# Altium footprint library Sajad_Altium_Library.PcbLib: 380 footprints (part 24 of 24)
Each footprint in its own frame and in the unit in brackets; x right, y up, seen from the top. Pads: shape width x height; smd on the part's side, far side on the other; paste and mask are expansions set on the pad; w line width, h text height; cw(c..) or ccw(c..) is an arc to the next point about the centre after c.
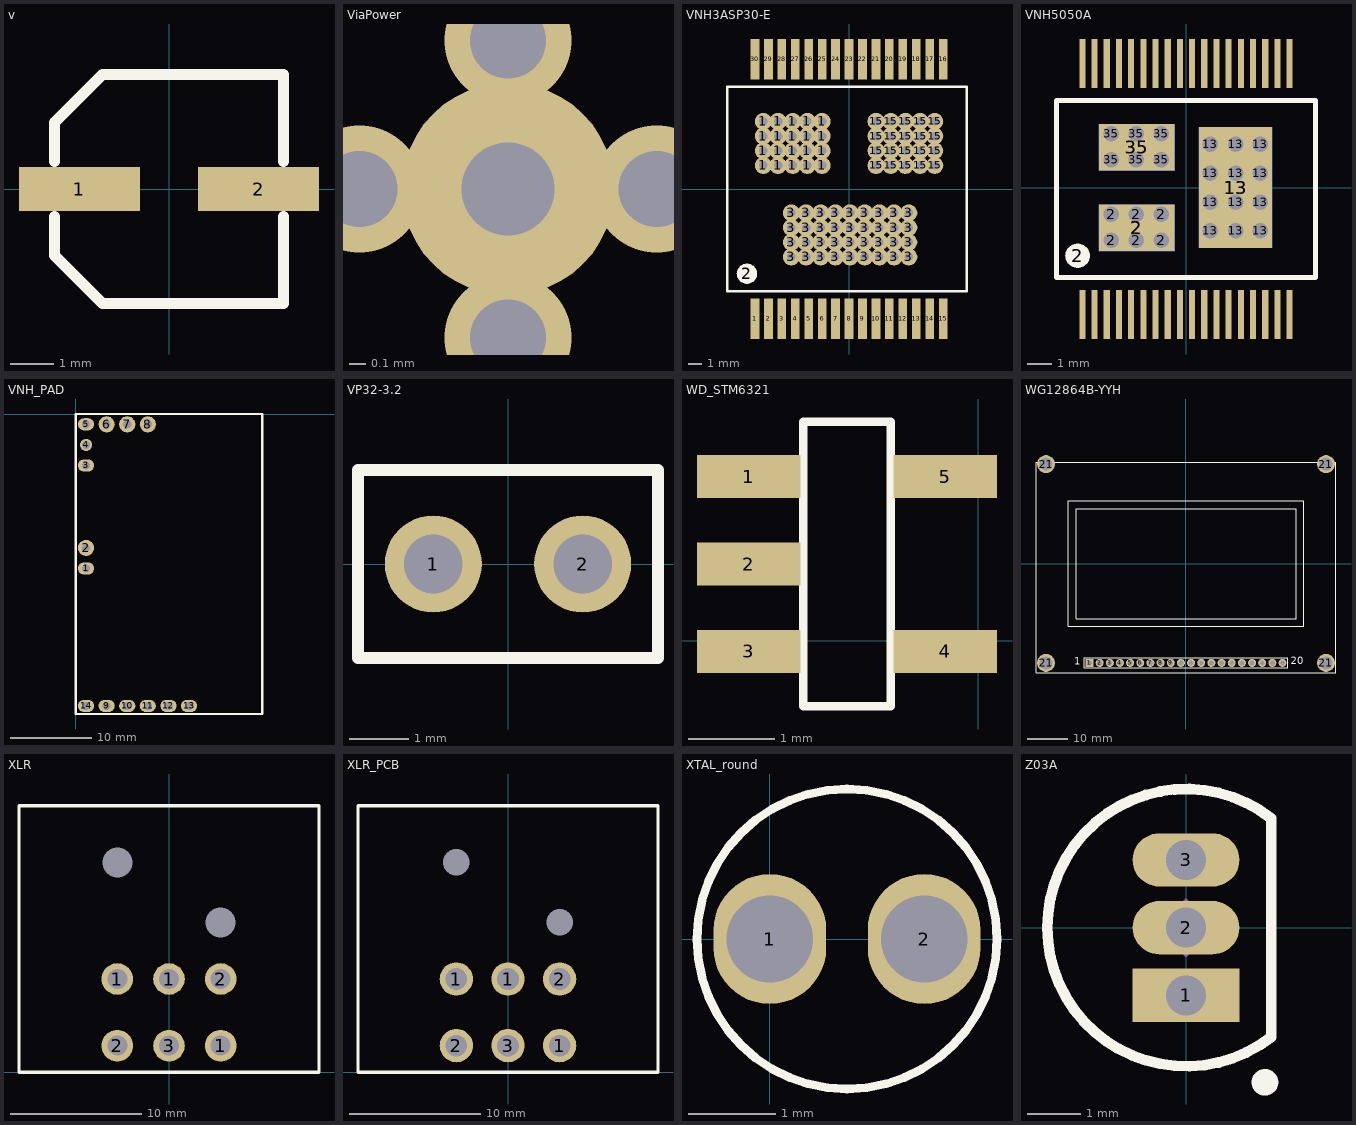
[diagram p23: the footprints below, top view; thin cyan lines are the x and y axes]

## v [mm] "5 x 5.5mm Smd Capacitor"
pads (2):
  rect 2.8x1.016 smd: 1(-2.073,0) 2(2.073,0)
Top Overlay:
  lines w0.254: -2.65,-0.635 -2.65,-1.541 -1.541,-2.65 2.65,-2.65 2.65,-0.635 ; -2.65,0.635 -2.65,1.541 -1.541,2.65 2.65,2.65 2.65,0.635
3D body: height 5.41, standoff 0, extent -2.95,-2.65 2.95,2.65

## ViaPower [mil]
pads (1):
  round 50 hole 22: ""(0,0)
via 0,-35 diameter 30 hole 18
via -35,0 diameter 30 hole 18
via 0,35 diameter 30 hole 18
via 35,0 diameter 30 hole 18
Multi-Layer:
  region: -35.3,0 -34.1,9.14 -30.57,17.65 -24.96,24.96 -17.65,30.57 -9.14,34.1 0,35.3 9.14,34.1 17.65,30.57 24.96,24.96 30.57,17.65 34.1,9.14 35.3,0 34.1,-9.14 30.57,-17.65 24.96,-24.96 17.65,-30.57 9.14,-34.1 0,-35.3 -9.14,-34.1 -17.65,-30.57 -24.96,-24.96 -30.57,-17.65 -34.1,-9.14

## VNH3ASP30-E [mil]
pads (107):
  rect 25.59x118.11 smd: 1(-275.59,-380.24) 2(-236.22,-380.24) 3(-196.85,-380.24) 4(-157.48,-380.24) 5(-118.11,-380.24) 6(-78.74,-380.24) 7(-39.37,-380.24) 8(0,-380.24) 9(39.37,-380.24) 10(78.74,-380.24) 11(118.11,-380.24) 12(157.48,-380.24) 13(196.85,-380.24) 14(236.22,-380.24) 15(275.59,-380.24) 16(275.59,380.24) 17(236.22,380.24) 18(196.85,380.24) 19(157.48,380.24) 20(118.11,380.24) 21(78.74,380.24) 22(39.37,380.24) 23(0,380.24) 24(-39.37,380.24) 25(-78.74,380.24) 26(-118.11,380.24) 27(-157.48,380.24) 28(-196.85,380.24) 29(-236.22,380.24) 30(-275.59,380.24)
  round 50 hole 25: 1(-251,69) 1(-251,112) 1(-251,155) 1(-251,198) 1(-208,69) 1(-208,112) 1(-208,155) 1(-208,198) 1(-165,69) 1(-165,112) 1(-165,155) 1(-165,198) 1(-122,69) 1(-122,112) 1(-122,155) 1(-122,198) 1(-79,69) 1(-79,112) 1(-79,155) 1(-79,198) 3(-169,-199) 3(-169,-156) 3(-169,-113) 3(-169,-70) 3(-126,-199) 3(-126,-156) 3(-126,-113) 3(-126,-70) 3(-83,-199) 3(-83,-156) 3(-83,-113) 3(-83,-70) 3(-40,-199) 3(-40,-156) 3(-40,-113) 3(-40,-70) 3(3,-199) 3(3,-156) 3(3,-113) 3(3,-70) 3(46,-199) 3(46,-156) 3(46,-113) 3(46,-70) 3(89,-199) 3(89,-156) 3(89,-113) 3(89,-70) 3(132,-199) 3(132,-156) 3(132,-113) 3(132,-70) 3(175,-199) 3(175,-156) 3(175,-113) 3(175,-70) 15(79,69) 15(79,112) 15(79,155) 15(79,198) 15(122,69) 15(122,112) 15(122,155) 15(122,198) 15(165,69) 15(165,112) 15(165,155) 15(165,198) 15(208,69) 15(208,112) 15(208,155) 15(208,198) 15(251,69) 15(251,112) 15(251,155) 15(251,198)
  round 60 on Top Overlay: 2(-299,-248)
Top Overlay:
  lines w7.87: -356.45,-299.8 -356.45,299.8 ; -355.98,-299.8 344.49,-299.8 344.49,299.8 -355.98,299.8
Multi-Layer:
  rectangle: -203,-237 203,-30
  region: 288,236 43,236 43,29 288,29
  rectangle: -288,29 -43,236
3D body: height 93.41, standoff -3.69, extent -339.33,-374.02 337.84,374.02

## VNH5050A [mm]
pads (67):
  rect 0.25x2 smd: 1(-4.25,-5.207) 2(-3.75,-5.207) 3(-3.25,-5.207) 4(-2.75,-5.207) 5(-2.25,-5.207) 6(-1.75,-5.207) 7(-1.25,-5.207) 8(-0.75,-5.207) 9(-0.25,-5.207) 10(0.25,-5.207) 11(0.75,-5.207) 12(1.25,-5.207) 13(1.75,-5.207) 14(2.25,-5.207) 15(2.75,-5.207) 16(3.25,-5.207) 17(3.75,-5.207) 18(4.25,-5.207) 19(4.25,5.093) 20(3.75,5.093) 21(3.25,5.093) 22(2.75,5.093) 23(2.25,5.093) 24(1.75,5.093) 25(1.25,5.093) 26(0.75,5.093) 27(0.25,5.093) 28(-0.25,5.093) 29(-0.75,5.093) 30(-1.25,5.093) 31(-1.75,5.093) 32(-2.25,5.093) 33(-2.75,5.093) 34(-3.25,5.093) 35(-3.75,5.093) 36(-4.25,5.093)
  round 1.016 on Top Overlay: 2(-4.445,-2.794)
  round 0.762 hole 0.635: 2(-3.068,-2.159) 2(-3.068,-1.101) 2(-2.032,-2.159) 2(-2.032,-1.101) 2(-1.016,-2.159) 2(-1.016,-1.101) 13(0.996,-1.778) 13(0.996,-0.593) 13(0.996,0.593) 13(0.996,1.778) 13(2.032,-1.778) 13(2.032,-0.593) 13(2.032,0.593) 13(2.032,1.778) 13(3.048,-1.778) 13(3.048,-0.593) 13(3.048,0.593) 13(3.048,1.778) 35(-3.068,1.143) 35(-3.068,2.201) 35(-2.032,1.143) 35(-2.032,2.201) 35(-1.016,1.143) 35(-1.016,2.201)
  rect 3.1x1.9 smd: 2(-2.02,-1.65) 35(-2.02,1.65)
  rect 3.1x1.9 smd far side: 2(-2.02,-1.65) 35(-2.02,1.65)
  rect 3x4.95 smd: 13(2.032,0)
  rect 3x4.95 smd far side: 13(2.032,0)
Top Overlay:
  lines w0.2: -5.303,-3.678 5.303,-3.678 5.303,3.564 -5.303,3.564 -5.303,-3.678

## VNH_PAD [mm]
pads (14):
  oval 2x1.5 hole 1: 1(1.27,-19.05) 3(1.27,-6.35) 5(1.27,-1.27) 9(3.81,-36) 10(6.35,-36) 11(8.89,-36) 12(11.43,-36) 13(13.97,-36) 14(1.27,-36)
  round 2 hole 1: 2(1.27,-16.51) 6(3.81,-1.27) 7(6.35,-1.27) 8(8.89,-1.27)
  round 1.5 hole 1: 4(1.27,-3.81)
Top Overlay:
  lines w0.254: 0,-37 23,-37 23,0 0,0 0,-37

## VP32-3.2 [mm] "Capacitor, Ceramic, Thru-Hole, Dipped Radial; Body 5.1 x 3.2 mm (WxT) Pin Spacing 2.54 mm (typ)"
height 6
pads (2):
  round 1.65 hole 1: 1(-1.27,0) 2(1.27,0)
Top Overlay:
  lines w0.2: -2.55,-1.6 2.55,-1.6 2.55,1.6 -2.55,1.6 -2.55,-1.6
3D body: height 6.12, standoff -1.8, extent -2.917,-0.848 2.921,0.848

## WD_STM6321 [mm]
pads (5):
  rect 1.2x0.5 smd: 1(-2.667,1.905) 2(-2.667,0.889) 3(-2.667,-0.127) 4(-0.381,-0.127) 5(-0.381,1.905)
Top Overlay:
  lines w0.1: -2.032,-0.762 -1.016,-0.762 -1.016,2.54 -2.032,2.54 -2.032,-0.762

## WG12864B-YYH [mm] "Lcd Module"
pads (24):
  rect 2x2 hole 1.2: 1(-24.13,-24.85)
  round 2 hole 1.2: 2(-21.59,-24.85) 3(-19.05,-24.85) 4(-16.51,-24.85) 5(-13.97,-24.85) 6(-11.43,-24.85) 7(-8.89,-24.85) 8(-6.35,-24.85) 9(-3.81,-24.85) 10(-1.27,-24.85) 11(1.27,-24.85) 12(3.81,-24.85) 13(6.35,-24.85) 14(8.89,-24.85) 15(11.43,-24.85) 16(13.97,-24.85) 17(16.51,-24.85) 18(19.05,-24.85) 19(21.59,-24.85) 20(24.13,-24.85)
  round 4.5 hole 3.2: 21(-35,-24.85) 21(-35,24.85) 21(35,24.85) 21(35,-24.85)
Top Overlay:
  lines w0.2: 15.24,-26.12 -25.4,-26.12 -25.4,-23.58 -23.495,-23.58 15.24,-23.58 ; 25.4,-26.12 25.4,-23.58 ; -37.5,-27.35 -37.5,25.35 37.5,25.35 37.5,-27.35 -37.5,-27.35
  lines w0.203: 15.24,-26.12 25.4,-26.12 ; 15.24,-23.58 25.4,-23.58 15.24,-23.58
  lines w0.254: -29.4,-15.7 -29.4,15.7 29.4,15.7 29.4,-15.7 -29.4,-15.7 ; -27.5,-13.75 27.5,-13.75 27.5,13.75 -27.5,13.75 -27.5,-13.75
  text "1" at -27.915,-25.917 h3.05
  text "20" at 26.238,-25.79 h3.05

## XLR [mil]
pads (8):
  round 0 hole 90: 0(-155,630) 0(155,450)
  round 95 hole 60: 1(-155,280) 1(0,280) 1(155,80) 2(-155,80) 2(155,280) 3(0,80)
Top Overlay:
  lines w10: -450,0 -450,800 450,800 450,0 -450,0
3D body: height 922.13, standoff -152.68, extent -492.12,30 492.12,1218.98

## XLR_PCB [mil]
pads (8):
  round 0 hole 80: 0(-155,630) 0(155,450)
  round 100 hole 65: 1(-155,280) 1(0,280) 1(155,80) 2(-155,80) 2(155,280) 3(0,80)
Top Overlay:
  lines w10: -450,0 450,0 450,800 -450,800 -450,0
3D body: height 1143.27, standoff -145.96, extent -492.12,-25 492.12,1000.59

## XTAL_round [mm]
height 0.55
pads (2):
  oval 1.3x1.5 hole 1: 1(0,0) 2(1.778,0)
Top Overlay:
  circle w0.1: c0.889,0 r1.727

## Z03A [mm] "TO, Flat Index; 3 In-Line, Axial Leads; Body Dia. 5mm; Leads 0.55 x 0.50 mm (max)"
height 5.2
pads (3):
  rect 2x1 hole 0.75: 1(0,-1.27)
  oval 2x1 hole 0.75: 2(0,0) 3(0,1.27)
Top Overlay:
  circle w0.25: c1.48,-2.9 r0.125
  lines w0.2: 1.601,-2.049 cw(c0,0) 1.601,2.049 1.6,-2.049
Mechanical 13:
  lines w0.1: 1.601,-2.049 cw(c0,0) 1.601,2.049 1.6,-2.049
Mechanical 15:
  lines w0.1: -0.5,0 0.5,0 ; 0,-0.5 0,0.5
3D body: height 5.2, standoff 0, extent -2.612,-2.612 1.6,2.612